# Altium footprint library STM32F0.PcbLib: 228 footprints (part 14 of 16)
Each footprint in its own frame and in the unit in brackets; x right, y up, seen from the top. Pads: shape width x height; smd on the part's side, far side on the other; paste and mask are expansions set on the pad; w line width, h text height; cw(c..) or ccw(c..) is an arc to the next point about the centre after c.
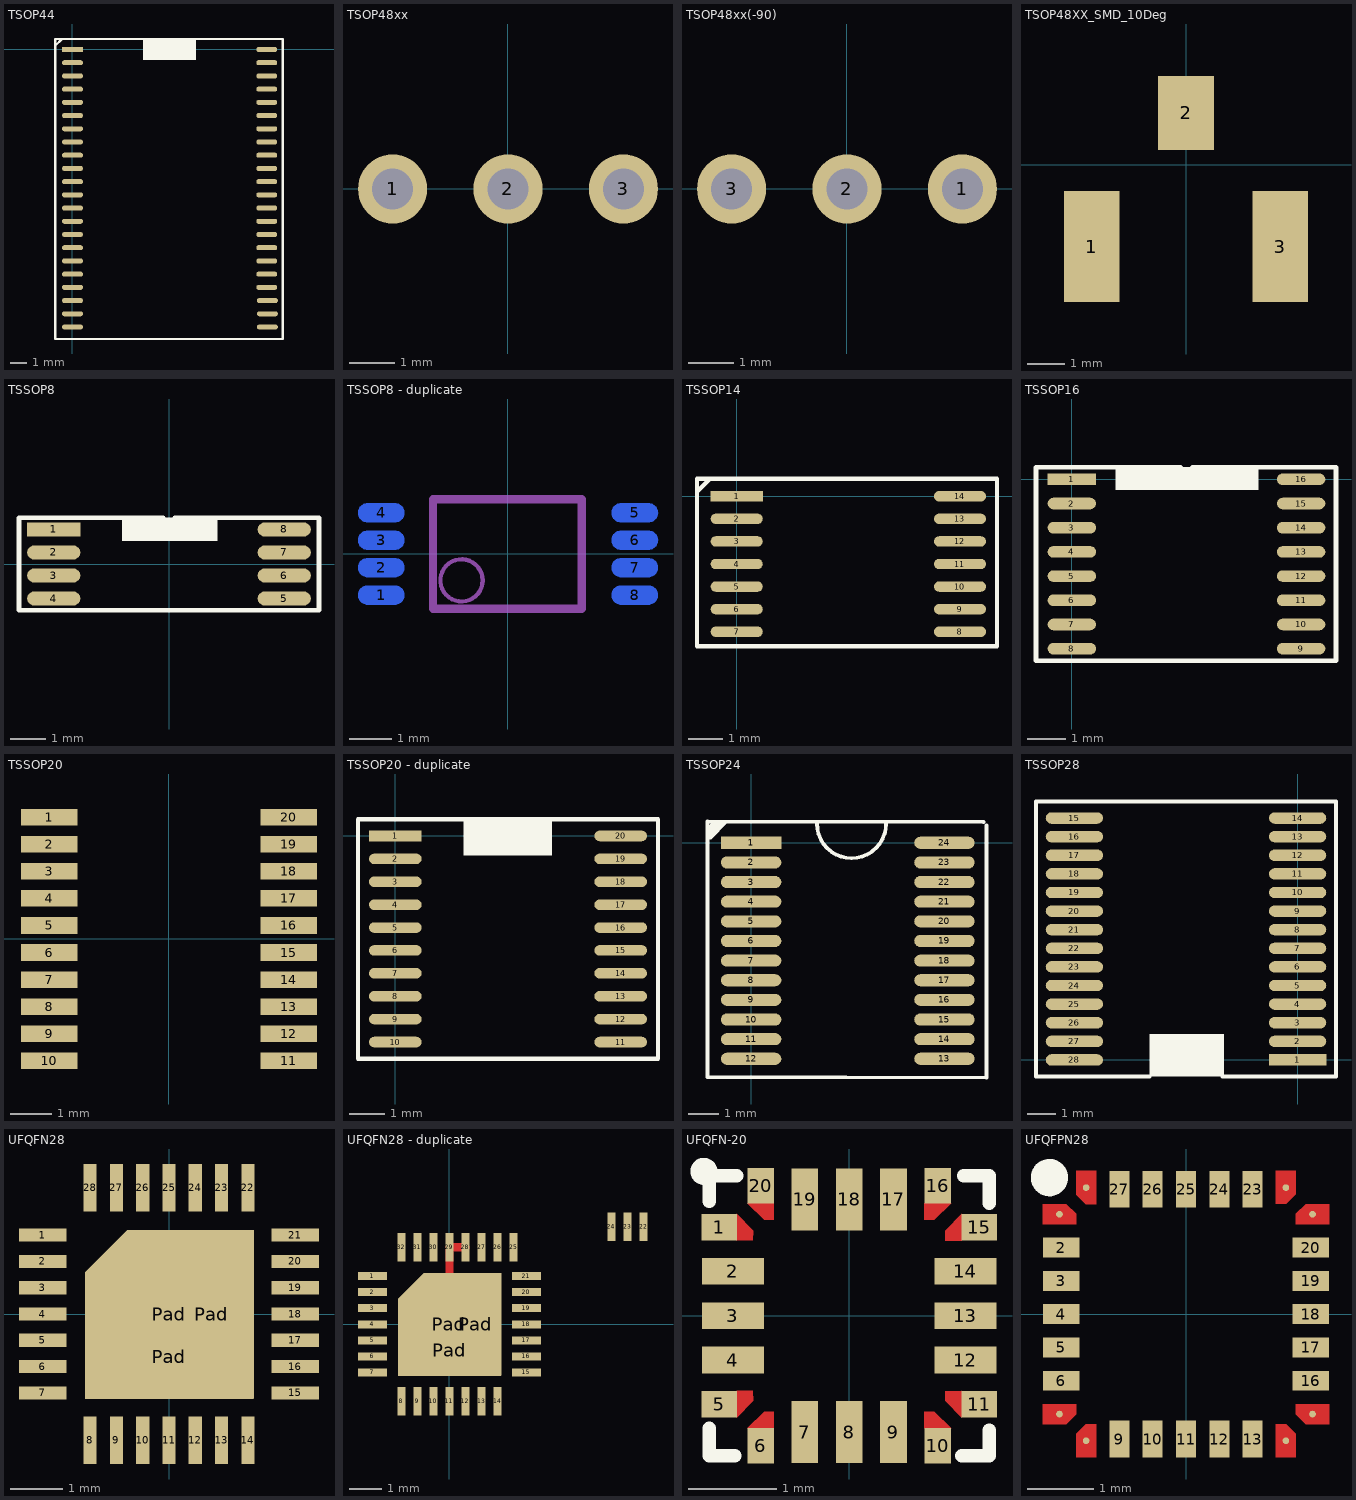
[diagram p13: the footprints below, top view; thin cyan lines are the x and y axes]

## TSOP44 [mil]
pads (44):
  rect 50x12 smd: 1(0,0)
  oval 50x12 smd: 2(0,-31.5) 3(0,-62.99) 4(0,-94.49) 5(0,-125.98) 6(0,-157.48) 7(0,-188.98) 8(0,-220.47) 9(0,-251.97) 10(0,-283.46) 11(0,-314.96) 12(0,-346.46) 13(0,-377.95) 14(0,-409.45) 15(0,-440.94) 16(0,-472.44) 17(0,-503.94) 18(0,-535.43) 19(0,-566.93) 20(0,-598.43) 21(0,-629.92) 22(0,-661.42) 23(464.57,-661.42) 24(464.57,-629.92) 25(464.57,-598.43) 26(462.99,-566.93) 27(462.99,-535.43) 28(462.99,-503.94) 29(462.99,-472.44) 30(462.99,-440.95) 31(462.99,-409.45) 32(462.99,-377.95) 33(462.99,-346.46) 34(462.99,-314.96) 35(462.99,-283.47) 36(462.99,-251.97) 37(462.99,-220.47) 38(462.99,-188.98) 39(462.99,-157.48) 40(462.99,-125.99) 41(462.99,-94.49) 42(462.99,-62.99) 43(462.99,-31.5) 44(462.99,0)
Top Overlay:
  rectangle: 168.31,-24.61 294.29,25
  lines w5: -41,7 -41,9 -25,25 ; -41,-690 -41,25 501,25 501,-690 -41,-690
3D body: height 12, standoff 0, extent -4,-5.68 18,6.32
3D body: height 25, standoff 12, extent 9.5,-5.68 42,6.32
3D body: height 12, standoff 0, extent -4,-37.18 18,-25.18
3D body: height 25, standoff 12, extent 9.5,-37.18 42,-25.18
3D body: height 12, standoff 0, extent -4,-68.68 18,-56.68
3D body: height 25, standoff 12, extent 9.5,-68.68 42,-56.68
3D body: height 12, standoff 0, extent -4,-100.17 18,-88.17
3D body: height 25, standoff 12, extent 9.5,-100.17 42,-88.17
3D body: height 25, standoff 12, extent 9.5,-226.16 42,-214.16
3D body: height 12, standoff 0, extent -4,-226.16 18,-214.16
3D body: height 25, standoff 12, extent 9.5,-194.66 42,-182.66
3D body: height 12, standoff 0, extent -4,-194.66 18,-182.66
3D body: height 25, standoff 12, extent 9.5,-163.16 42,-151.16
3D body: height 12, standoff 0, extent -4,-163.16 18,-151.16
3D body: height 25, standoff 12, extent 9.5,-131.67 42,-119.67
3D body: height 12, standoff 0, extent -4,-131.67 18,-119.67
3D body: height 25, standoff 12, extent 9.5,-352.14 42,-340.14
3D body: height 12, standoff 0, extent -4,-352.14 18,-340.14
3D body: height 25, standoff 12, extent 9.5,-320.65 42,-308.65
3D body: height 12, standoff 0, extent -4,-320.65 18,-308.65
3D body: height 25, standoff 12, extent 9.5,-289.15 42,-277.15
3D body: height 12, standoff 0, extent -4,-289.15 18,-277.15
3D body: height 25, standoff 12, extent 9.5,-257.65 42,-245.65
3D body: height 12, standoff 0, extent -4,-257.65 18,-245.65
3D body: height 25, standoff 12, extent 9.5,-478.13 42,-466.13
3D body: height 12, standoff 0, extent -4,-478.13 18,-466.13
3D body: height 25, standoff 12, extent 9.5,-446.63 42,-434.63
3D body: height 12, standoff 0, extent -4,-446.63 18,-434.63
3D body: height 25, standoff 12, extent 9.5,-415.13 42,-403.13
3D body: height 12, standoff 0, extent -4,-415.13 18,-403.13
3D body: height 25, standoff 12, extent 9.5,-383.64 42,-371.64
3D body: height 12, standoff 0, extent -4,-383.64 18,-371.64
3D body: height 25, standoff 12, extent 9.5,-604.11 42,-592.11
3D body: height 12, standoff 0, extent -4,-604.11 18,-592.11
3D body: height 25, standoff 12, extent 9.5,-572.61 42,-560.61
3D body: height 12, standoff 0, extent -4,-572.61 18,-560.61
3D body: height 25, standoff 12, extent 9.5,-541.12 42,-529.12
3D body: height 12, standoff 0, extent -4,-541.12 18,-529.12
3D body: height 25, standoff 12, extent 9.5,-509.62 42,-497.62
3D body: height 12, standoff 0, extent -4,-509.62 18,-497.62
3D body: height 25, standoff 12, extent 9.5,-667.1 42,-655.1
3D body: height 12, standoff 0, extent -4,-667.1 18,-655.1
3D body: height 25, standoff 12, extent 9.5,-635.61 42,-623.61
3D body: height 12, standoff 0, extent -4,-635.61 18,-623.61
3D body: height 12, standoff 0, extent 444.99,-37.81 466.99,-25.81
3D body: height 25, standoff 12, extent 420.99,-37.81 453.49,-25.81
3D body: height 12, standoff 0, extent 444.99,-6.32 466.99,5.68
3D body: height 25, standoff 12, extent 420.99,-6.32 453.49,5.68
3D body: height 12, standoff 0, extent 444.99,-163.8 466.99,-151.8
3D body: height 25, standoff 12, extent 420.99,-163.8 453.49,-151.8
3D body: height 12, standoff 0, extent 444.99,-132.3 466.99,-120.3
3D body: height 25, standoff 12, extent 420.99,-132.3 453.49,-120.3
3D body: height 12, standoff 0, extent 444.99,-100.8 466.99,-88.8
3D body: height 25, standoff 12, extent 420.99,-100.8 453.49,-88.8
3D body: height 12, standoff 0, extent 444.99,-69.31 466.99,-57.31
3D body: height 25, standoff 12, extent 420.99,-69.31 453.49,-57.31
3D body: height 12, standoff 0, extent 444.99,-289.78 466.99,-277.78
3D body: height 25, standoff 12, extent 420.99,-289.78 453.49,-277.78
3D body: height 12, standoff 0, extent 444.99,-258.29 466.99,-246.29
3D body: height 25, standoff 12, extent 420.99,-258.29 453.49,-246.29
3D body: height 12, standoff 0, extent 444.99,-226.79 466.99,-214.79
3D body: height 25, standoff 12, extent 420.99,-226.79 453.49,-214.79
3D body: height 12, standoff 0, extent 444.99,-195.29 466.99,-183.29
3D body: height 25, standoff 12, extent 420.99,-195.29 453.49,-183.29
3D body: height 12, standoff 0, extent 444.99,-415.77 466.99,-403.77
3D body: height 25, standoff 12, extent 420.99,-415.77 453.49,-403.77
3D body: height 12, standoff 0, extent 444.99,-384.27 466.99,-372.27
3D body: height 25, standoff 12, extent 420.99,-384.27 453.49,-372.27
3D body: height 12, standoff 0, extent 444.99,-352.77 466.99,-340.77
3D body: height 25, standoff 12, extent 420.99,-352.77 453.49,-340.77
3D body: height 12, standoff 0, extent 444.99,-321.28 466.99,-309.28
3D body: height 25, standoff 12, extent 420.99,-321.28 453.49,-309.28
3D body: height 12, standoff 0, extent 444.99,-541.75 466.99,-529.75
3D body: height 25, standoff 12, extent 420.99,-541.75 453.49,-529.75
3D body: height 12, standoff 0, extent 444.99,-510.25 466.99,-498.25
3D body: height 25, standoff 12, extent 420.99,-510.25 453.49,-498.25
3D body: height 12, standoff 0, extent 444.99,-478.76 466.99,-466.76
3D body: height 25, standoff 12, extent 420.99,-478.76 453.49,-466.76
3D body: height 12, standoff 0, extent 444.99,-447.26 466.99,-435.26
3D body: height 25, standoff 12, extent 420.99,-447.26 453.49,-435.26
3D body: height 25, standoff 12, extent 420.99,-573.25 453.49,-561.25
3D body: height 12, standoff 0, extent 444.99,-573.25 466.99,-561.25
3D body: height 25, standoff 12, extent 420.99,-604.74 453.49,-592.74
3D body: height 12, standoff 0, extent 444.99,-604.74 466.99,-592.74
3D body: height 25, standoff 12, extent 420.99,-636.24 453.49,-624.24
3D body: height 12, standoff 0, extent 444.99,-636.24 466.99,-624.24
3D body: height 25, standoff 12, extent 420.99,-667.73 453.49,-655.73
3D body: height 12, standoff 0, extent 444.99,-667.73 466.99,-655.73
3D body: height 40, standoff 0, extent 39.04,-685 423,24
3D body: height 41, standoff 40, extent 195.5,-9 273.5,16

## TSOP48xx [mil]
pads (3):
  round 60 hole 35.43: 1(-100,0) 2(0,0) 3(100,0)
3D body "IRreciver.stp": height 323.82, standoff -38.53, extent -118.1,-154.92 118.12,50.01

## TSOP48xx(-90) [mil]
pads (3):
  round 60 hole 35.43: 1(100,0) 2(0,0) 3(-100,0)
3D body "IRreciverBotton.stp": height 165.35, standoff -39.57, extent -118.11,-12.5 118.11,369.53

## TSOP48XX_SMD_10Deg [mm]
pads (3):
  rect 1.5x3 smd: 1(-2.54,-2.2) 3(2.54,-2.2)
  rect 1.5x2 smd: 2(0,1.4)
3D body "IRreciverSMD10deg.stp": height 9.33, standoff -1.02, extent -3,-5.254 3,2.11

## TSSOP8 [mm]
pads (8):
  rect 1.5x0.4 smd: 1(-3.25,0.975)
  oval 1.5x0.4 smd: 2(-3.25,0.325) 3(-3.25,-0.325) 4(-3.25,-0.975) 5(3.25,-0.975) 6(3.25,-0.325) 7(3.25,0.325) 8(3.25,0.975)
Top Overlay:
  rectangle: -1.32,0.645 1.373,1.305
  lines w0.127: -0.163,1.3 -4.23,1.3 -4.23,-1.3 4.23,-1.3 4.23,1.3 0.162,1.3
3D body: height 1.02, standoff 0, extent -2.424,-1.286 2.351,1.28
3D body: height 0.3, standoff 0, extent -3.314,0.797 -2.755,1.102
3D body: height 0.64, standoff 0.3, extent -2.971,0.797 -2.145,1.102
3D body: height 1.04, standoff 1.02, extent -1.028,0.594 0.954,1.229
3D body: height 0.64, standoff 0.3, extent -2.971,0.162 -2.145,0.467
3D body: height 0.3, standoff 0, extent -3.314,0.162 -2.755,0.467
3D body: height 0.64, standoff 0.3, extent -2.971,-0.473 -2.145,-0.168
3D body: height 0.3, standoff 0, extent -3.314,-0.473 -2.755,-0.168
3D body: height 0.64, standoff 0.3, extent -2.971,-1.108 -2.145,-0.803
3D body: height 0.3, standoff 0, extent -3.314,-1.108 -2.755,-0.803
3D body: height 0.64, standoff 0.3, extent 2.097,-1.108 2.922,-0.803
3D body: height 0.3, standoff 0, extent 2.706,-1.108 3.265,-0.803
3D body: height 0.64, standoff 0.3, extent 2.097,-0.473 2.922,-0.168
3D body: height 0.3, standoff 0, extent 2.706,-0.473 3.265,-0.168
3D body: height 0.64, standoff 0.3, extent 2.097,0.162 2.922,0.467
3D body: height 0.3, standoff 0, extent 2.706,0.162 3.265,0.467
3D body: height 0.64, standoff 0.3, extent 2.097,0.797 2.922,1.102
3D body: height 0.3, standoff 0, extent 2.706,0.797 3.265,1.102

## TSSOP8 - duplicate [mm]
height 1.2
pads (8):
  oval 1.1x0.45 smd far side: 1(-3,-0.975) 2(-3,-0.325) 3(-3,0.325) 4(-3,0.975) 5(3,0.975) 6(3,0.325) 7(3,-0.325) 8(3,-0.975)
Bottom Overlay:
  lines w0.2: -1.775,-1.3 -1.775,1.3 1.775,1.3 1.775,-1.3 0.7,-1.3 ccw(c0,-1.3) -0.7,-1.3 -1.775,-1.3
Bottom Assembly:
  circle w0.1: c-1.1,-0.625 r0.5
  lines w0.2: -1.775,-1.3 1.75,-1.3 1.75,1.3 -1.775,1.3 -1.775,-1.3
  text ".Designator" at -0.571,-1.67 h1
3D body "TSSOP8.step": height 1.11, standoff 0.02, extent -3.14,-1.4 3.14,1.6

## TSSOP14 [mm]
pads (14):
  rect 1.5x0.3 smd: 1(0,0)
  oval 1.5x0.3 smd: 2(0,-0.65) 3(0,-1.3) 4(0,-1.95) 5(0,-2.6) 6(0,-3.25) 7(0,-3.9) 8(6.426,-3.9) 9(6.426,-3.25) 10(6.426,-2.6) 11(6.426,-1.95) 12(6.426,-1.3) 13(6.426,-0.65) 14(6.426,0)
Top Overlay:
  lines w0.127: -1.143,0.127 -0.762,0.508 -1.143,0.508 ; -1.143,0.508 -1.143,-4.318 7.493,-4.318 7.493,0.508 -1.143,0.508
3D body: height 0.3, standoff 0, extent 5.905,-0.178 6.464,0.127
3D body: height 0.64, standoff 0.3, extent 5.296,-0.178 6.121,0.127
3D body: height 0.3, standoff 0, extent 5.905,-0.813 6.464,-0.508
3D body: height 0.64, standoff 0.3, extent 5.296,-0.813 6.121,-0.508
3D body: height 0.3, standoff 0, extent 5.905,-1.448 6.464,-1.143
3D body: height 0.64, standoff 0.3, extent 5.296,-1.448 6.121,-1.143
3D body: height 0.3, standoff 0, extent 5.905,-2.083 6.464,-1.778
3D body: height 0.64, standoff 0.3, extent 5.296,-2.083 6.121,-1.778
3D body: height 0.3, standoff 0, extent 5.905,-2.718 6.464,-2.413
3D body: height 0.64, standoff 0.3, extent 5.296,-2.718 6.121,-2.413
3D body: height 0.3, standoff 0, extent 5.905,-3.353 6.464,-3.048
3D body: height 0.64, standoff 0.3, extent 5.296,-3.353 6.121,-3.048
3D body: height 0.3, standoff 0, extent 5.905,-3.988 6.464,-3.683
3D body: height 0.64, standoff 0.3, extent 5.296,-3.988 6.121,-3.683
3D body: height 0.3, standoff 0, extent -0.114,-3.988 0.445,-3.683
3D body: height 0.64, standoff 0.3, extent 0.229,-3.988 1.054,-3.683
3D body: height 0.3, standoff 0, extent -0.114,-3.353 0.445,-3.048
3D body: height 0.64, standoff 0.3, extent 0.229,-3.353 1.054,-3.048
3D body: height 0.3, standoff 0, extent -0.114,-2.718 0.445,-2.413
3D body: height 0.64, standoff 0.3, extent 0.229,-2.718 1.054,-2.413
3D body: height 0.3, standoff 0, extent -0.114,-2.083 0.445,-1.778
3D body: height 0.64, standoff 0.3, extent 0.229,-2.083 1.054,-1.778
3D body: height 0.3, standoff 0, extent -0.114,-1.448 0.445,-1.143
3D body: height 0.64, standoff 0.3, extent 0.229,-1.448 1.054,-1.143
3D body: height 0.3, standoff 0, extent -0.114,-0.813 0.445,-0.508
3D body: height 0.64, standoff 0.3, extent 0.229,-0.813 1.054,-0.508
3D body: height 1.04, standoff 1.02, extent 2.172,-0.381 4.153,0.254
3D body: height 0.64, standoff 0.3, extent 0.229,-0.178 1.054,0.127
3D body: height 0.3, standoff 0, extent -0.114,-0.178 0.445,0.127
3D body: height 1.02, standoff 0, extent 0.774,-4.318 5.55,0.508

## TSSOP16 [mil]
pads (16):
  rect 50x12 smd: 1(0,0)
  oval 50x12 smd: 2(0,-25) 3(0,-50) 4(0,-75) 5(0,-100) 6(0,-125) 7(0,-150) 8(0,-175) 9(237,-175) 10(237,-150) 11(237,-125) 12(237,-100) 13(237,-75) 14(237,-50) 15(237,-25) 16(237,0)
Top Overlay:
  rectangle: 45,-11 193,12.5
  lines w5: 112.25,12.5 -37,12.5 -37,-187.5 273,-187.5 273,12.5 124.75,12.5
3D body: height 40, standoff 0, extent 24.04,-188 212,13
3D body: height 12, standoff 0, extent -11,-6 11,6
3D body: height 25, standoff 12, extent 2.5,-6 35,6
3D body: height 41, standoff 40, extent 79,-14 157,11
3D body: height 25, standoff 12, extent 2.5,-31 35,-19
3D body: height 12, standoff 0, extent -11,-31 11,-19
3D body: height 25, standoff 12, extent 2.5,-56 35,-44
3D body: height 12, standoff 0, extent -11,-56 11,-44
3D body: height 25, standoff 12, extent 2.5,-81 35,-69
3D body: height 12, standoff 0, extent -11,-81 11,-69
3D body: height 25, standoff 12, extent 2.5,-106 35,-94
3D body: height 12, standoff 0, extent -11,-106 11,-94
3D body: height 25, standoff 12, extent 2.5,-131 35,-119
3D body: height 12, standoff 0, extent -11,-131 11,-119
3D body: height 25, standoff 12, extent 2.5,-156 35,-144
3D body: height 12, standoff 0, extent -11,-156 11,-144
3D body: height 25, standoff 12, extent 2.5,-181 35,-169
3D body: height 12, standoff 0, extent -11,-181 11,-169
3D body: height 25, standoff 12, extent 202,-181 234.5,-169
3D body: height 12, standoff 0, extent 226,-181 248,-169
3D body: height 25, standoff 12, extent 202,-156 234.5,-144
3D body: height 12, standoff 0, extent 226,-156 248,-144
3D body: height 25, standoff 12, extent 202,-131 234.5,-119
3D body: height 12, standoff 0, extent 226,-131 248,-119
3D body: height 25, standoff 12, extent 202,-106 234.5,-94
3D body: height 12, standoff 0, extent 226,-106 248,-94
3D body: height 25, standoff 12, extent 202,-81 234.5,-69
3D body: height 12, standoff 0, extent 226,-81 248,-69
3D body: height 25, standoff 12, extent 202,-56 234.5,-44
3D body: height 12, standoff 0, extent 226,-56 248,-44
3D body: height 25, standoff 12, extent 202,-31 234.5,-19
3D body: height 12, standoff 0, extent 226,-31 248,-19
3D body: height 25, standoff 12, extent 202,-6 234.5,6
3D body: height 12, standoff 0, extent 226,-6 248,6

## TSSOP20 [mm]
pads (20):
  rect 1.35x0.4 smd: 1(-2.875,2.925) 2(-2.875,2.275) 3(-2.875,1.625) 4(-2.875,0.975) 5(-2.875,0.325) 6(-2.875,-0.325) 7(-2.875,-0.975) 8(-2.875,-1.625) 9(-2.875,-2.275) 10(-2.875,-2.925) 11(2.875,-2.925) 12(2.875,-2.275) 13(2.875,-1.625) 14(2.875,-0.975) 15(2.875,-0.325) 16(2.875,0.325) 17(2.875,0.975) 18(2.875,1.625) 19(2.875,2.275) 20(2.875,2.925)
3D body "User Library-tssop-20-1.step": height 1.2, standoff 0, extent -3.325,-3.3 3.275,3.3

## TSSOP20 - duplicate [mm]
pads (20):
  rect 1.5x0.3 smd: 1(0,0)
  oval 1.5x0.3 smd: 2(0,-0.65) 3(0,-1.3) 4(0,-1.95) 5(0,-2.6) 6(0,-3.25) 7(0,-3.9) 8(0,-4.55) 9(0,-5.2) 10(0,-5.85) 11(6.4,-5.85) 12(6.4,-5.2) 13(6.4,-4.55) 14(6.4,-3.9) 15(6.4,-3.25) 16(6.4,-2.6) 17(6.4,-1.95) 18(6.4,-1.3) 19(6.4,-0.65) 20(6.4,0)
Top Overlay:
  rectangle: 1.93,-0.559 4.445,0.479
  lines w0.127: -1.059,0 -1.059,0.055 ; -0.635,0.479 -1.059,0.479 ; -1.059,0.479 7.459,0.479 7.459,-6.329 -1.059,-6.329 -1.059,0.479
3D body: height 0.64, standoff 0.3, extent 0.241,-5.359 1.067,-5.055
3D body: height 0.3, standoff 0, extent -0.102,-5.359 0.457,-5.055
3D body: height 0.64, standoff 0.3, extent 0.241,-5.994 1.067,-5.69
3D body: height 0.3, standoff 0, extent -0.102,-5.994 0.457,-5.69
3D body: height 0.64, standoff 0.3, extent 5.309,-5.994 6.134,-5.69
3D body: height 0.3, standoff 0, extent 5.918,-5.994 6.477,-5.69
3D body: height 0.64, standoff 0.3, extent 5.309,-5.359 6.134,-5.055
3D body: height 0.3, standoff 0, extent 5.918,-5.359 6.477,-5.055
3D body: height 0.3, standoff 0, extent 5.931,-0.152 6.49,0.152
3D body: height 0.64, standoff 0.3, extent 5.321,-0.152 6.147,0.152
3D body: height 0.3, standoff 0, extent 5.931,-0.787 6.49,-0.483
3D body: height 0.64, standoff 0.3, extent 5.321,-0.787 6.147,-0.483
3D body: height 0.3, standoff 0, extent 5.931,-1.448 6.49,-1.143
3D body: height 0.64, standoff 0.3, extent 5.321,-1.448 6.147,-1.143
3D body: height 0.3, standoff 0, extent 5.931,-2.108 6.49,-1.803
3D body: height 0.64, standoff 0.3, extent 5.321,-2.108 6.147,-1.803
3D body: height 0.3, standoff 0, extent 5.931,-2.743 6.49,-2.438
3D body: height 0.64, standoff 0.3, extent 5.321,-2.743 6.147,-2.438
3D body: height 0.3, standoff 0, extent 5.931,-3.404 6.49,-3.099
3D body: height 0.64, standoff 0.3, extent 5.321,-3.404 6.147,-3.099
3D body: height 0.3, standoff 0, extent 5.931,-4.064 6.49,-3.759
3D body: height 0.64, standoff 0.3, extent 5.321,-4.064 6.147,-3.759
3D body: height 0.3, standoff 0, extent 5.931,-4.699 6.49,-4.394
3D body: height 0.64, standoff 0.3, extent 5.321,-4.699 6.147,-4.394
3D body: height 0.3, standoff 0, extent -0.089,-4.699 0.47,-4.394
3D body: height 0.64, standoff 0.3, extent 0.254,-4.699 1.079,-4.394
3D body: height 0.3, standoff 0, extent -0.089,-4.064 0.47,-3.759
3D body: height 0.64, standoff 0.3, extent 0.254,-4.064 1.079,-3.759
3D body: height 0.3, standoff 0, extent -0.089,-3.404 0.47,-3.099
3D body: height 0.64, standoff 0.3, extent 0.254,-3.404 1.079,-3.099
3D body: height 0.3, standoff 0, extent -0.089,-2.743 0.47,-2.438
3D body: height 0.64, standoff 0.3, extent 0.254,-2.743 1.079,-2.438
3D body: height 0.3, standoff 0, extent -0.089,-2.108 0.47,-1.803
3D body: height 0.64, standoff 0.3, extent 0.254,-2.108 1.079,-1.803
3D body: height 0.3, standoff 0, extent -0.089,-1.448 0.47,-1.143
3D body: height 0.64, standoff 0.3, extent 0.254,-1.448 1.079,-1.143
3D body: height 0.3, standoff 0, extent -0.089,-0.787 0.47,-0.483
3D body: height 0.64, standoff 0.3, extent 0.254,-0.787 1.079,-0.483
3D body: height 1.04, standoff 1.02, extent 2.197,-0.356 4.178,0.279
3D body: height 0.64, standoff 0.3, extent 0.254,-0.152 1.079,0.152
3D body: height 0.3, standoff 0, extent -0.089,-0.152 0.47,0.152
3D body: height 1.02, standoff 0, extent 0.801,-6.325 5.575,0.33

## TSSOP24 [mm]
pads (24):
  rect 2x0.4 smd: 1(0,0)
  oval 2x0.4 smd: 2(0,-0.65) 3(0,-1.3) 4(0,-1.95) 5(0,-2.6) 6(0,-3.25) 7(0,-3.9) 8(0,-4.55) 9(0,-5.2) 10(0,-5.85) 11(0,-6.5) 12(0,-7.15) 13(6.4,-7.15) 14(6.4,-6.5) 15(6.4,-5.85) 16(6.4,-5.2) 17(6.4,-4.55) 18(6.4,-3.9) 19(6.4,-3.25) 20(6.4,-2.6) 21(6.4,-1.95) 22(6.4,-1.3) 23(6.4,-0.65) 24(6.4,0)
Top Overlay:
  lines w0.127: 2.179,0.635 ccw(c3.325,0.635) 4.47,0.635 ; 7.696,0.686 -1.446,0.706 -1.446,-7.754 7.795,-7.78 7.795,0.579 ; -1.067,0.684 -1.067,0.686 -1.067,0.684 ; -1.067,0.684 -1.446,0.305 -1.446,0.432 -1.194,0.684 -1.067,0.684 ; -1.446,0.178 -0.938,0.686 -0.838,0.686 -1.346,0.178 -1.446,0.178
3D body: height 0.3, standoff 0, extent 5.867,-6.68 6.426,-6.375
3D body: height 0.64, standoff 0.3, extent 5.258,-6.68 6.083,-6.375
3D body: height 0.3, standoff 0, extent 5.867,-7.315 6.426,-7.01
3D body: height 0.64, standoff 0.3, extent 5.258,-7.315 6.083,-7.01
3D body: height 0.3, standoff 0, extent -0.152,-7.315 0.406,-7.01
3D body: height 0.64, standoff 0.3, extent 0.191,-7.315 1.016,-7.01
3D body: height 0.3, standoff 0, extent -0.152,-6.68 0.406,-6.375
3D body: height 0.64, standoff 0.3, extent 0.191,-6.68 1.016,-6.375
3D body: height 0.64, standoff 0.3, extent 0.191,-5.385 1.016,-5.08
3D body: height 0.3, standoff 0, extent -0.152,-5.385 0.406,-5.08
3D body: height 0.64, standoff 0.3, extent 0.191,-6.02 1.016,-5.715
3D body: height 0.3, standoff 0, extent -0.152,-6.02 0.406,-5.715
3D body: height 0.64, standoff 0.3, extent 5.258,-6.02 6.083,-5.715
3D body: height 0.3, standoff 0, extent 5.867,-6.02 6.426,-5.715
3D body: height 0.64, standoff 0.3, extent 5.258,-5.385 6.083,-5.08
3D body: height 0.3, standoff 0, extent 5.867,-5.385 6.426,-5.08
3D body: height 0.3, standoff 0, extent 5.88,-0.178 6.439,0.127
3D body: height 0.64, standoff 0.3, extent 5.271,-0.178 6.096,0.127
3D body: height 0.3, standoff 0, extent 5.88,-0.813 6.439,-0.508
3D body: height 0.64, standoff 0.3, extent 5.271,-0.813 6.096,-0.508
3D body: height 0.3, standoff 0, extent 5.88,-1.473 6.439,-1.168
3D body: height 0.64, standoff 0.3, extent 5.271,-1.473 6.096,-1.168
3D body: height 0.3, standoff 0, extent 5.88,-2.134 6.439,-1.829
3D body: height 0.64, standoff 0.3, extent 5.271,-2.134 6.096,-1.829
3D body: height 0.3, standoff 0, extent 5.88,-2.769 6.439,-2.464
3D body: height 0.64, standoff 0.3, extent 5.271,-2.769 6.096,-2.464
3D body: height 0.3, standoff 0, extent 5.88,-3.429 6.439,-3.124
3D body: height 0.64, standoff 0.3, extent 5.271,-3.429 6.096,-3.124
3D body: height 0.3, standoff 0, extent 5.88,-4.089 6.439,-3.785
3D body: height 0.64, standoff 0.3, extent 5.271,-4.089 6.096,-3.785
3D body: height 0.3, standoff 0, extent 5.88,-4.724 6.439,-4.42
3D body: height 0.64, standoff 0.3, extent 5.271,-4.724 6.096,-4.42
3D body: height 0.3, standoff 0, extent -0.14,-4.724 0.419,-4.42
3D body: height 0.64, standoff 0.3, extent 0.203,-4.724 1.029,-4.42
3D body: height 0.3, standoff 0, extent -0.14,-4.089 0.419,-3.785
3D body: height 0.64, standoff 0.3, extent 0.203,-4.089 1.029,-3.785
3D body: height 0.3, standoff 0, extent -0.14,-3.429 0.419,-3.124
3D body: height 0.64, standoff 0.3, extent 0.203,-3.429 1.029,-3.124
3D body: height 0.3, standoff 0, extent -0.14,-2.769 0.419,-2.464
3D body: height 0.64, standoff 0.3, extent 0.203,-2.769 1.029,-2.464
3D body: height 0.3, standoff 0, extent -0.14,-2.134 0.419,-1.829
3D body: height 0.64, standoff 0.3, extent 0.203,-2.134 1.029,-1.829
3D body: height 0.3, standoff 0, extent -0.14,-1.473 0.419,-1.168
3D body: height 0.64, standoff 0.3, extent 0.203,-1.473 1.029,-1.168
3D body: height 0.3, standoff 0, extent -0.14,-0.813 0.419,-0.508
3D body: height 0.64, standoff 0.3, extent 0.203,-0.813 1.029,-0.508
3D body: height 1.04, standoff 1.02, extent 2.146,-0.381 4.127,0.254
3D body: height 0.64, standoff 0.3, extent 0.203,-0.178 1.029,0.127
3D body: height 0.3, standoff 0, extent -0.14,-0.178 0.419,0.127
3D body: height 1.02, standoff 0, extent 0.75,-7.569 5.524,0.305

## TSSOP28 [mm]
pads (28):
  rect 2x0.4 smd: 1(0,0)
  oval 2x0.4 smd: 2(0,0.65) 3(0,1.3) 4(0,1.95) 5(0,2.6) 6(0,3.25) 7(0,3.9) 8(0,4.55) 9(0,5.2) 10(0,5.85) 11(0,6.5) 12(0,7.15) 13(0,7.8) 14(0,8.45) 15(-7.8,8.45) 16(-7.8,7.8) 17(-7.8,7.15) 18(-7.8,6.5) 19(-7.8,5.85) 20(-7.8,5.2) 21(-7.8,4.55) 22(-7.8,3.9) 23(-7.8,3.25) 24(-7.8,2.6) 25(-7.8,1.95) 26(-7.8,1.3) 27(-7.8,0.65) 28(-7.8,0)
Top Overlay:
  rectangle: -5.17,-0.579 -2.575,0.9
  lines w0.127: -5.17,-0.579 -9.14,-0.579 -9.14,9.029 1.34,9.029 1.34,-0.579 -2.63,-0.579
3D body: height 0.3, standoff 0, extent -7.201,7.645 -6.642,7.95
3D body: height 0.64, standoff 0.3, extent -6.858,7.645 -6.032,7.95
3D body: height 0.3, standoff 0, extent -7.201,8.28 -6.642,8.585
3D body: height 0.64, standoff 0.3, extent -6.858,8.28 -6.032,8.585
3D body: height 0.3, standoff 0, extent -1.181,8.28 -0.622,8.585
3D body: height 0.64, standoff 0.3, extent -1.791,8.28 -0.965,8.585
3D body: height 0.3, standoff 0, extent -1.181,7.645 -0.622,7.95
3D body: height 0.64, standoff 0.3, extent -1.791,7.645 -0.965,7.95
3D body: height 1.02, standoff 0, extent -6.223,-0.33 -1.449,8.788
3D body: height 0.3, standoff 0, extent -1.118,-0.152 -0.559,0.152
3D body: height 0.64, standoff 0.3, extent -1.727,-0.152 -0.902,0.152
3D body: height 1.04, standoff 1.02, extent -4.826,-0.279 -2.845,0.356
3D body: height 0.64, standoff 0.3, extent -1.727,0.483 -0.902,0.787
3D body: height 0.3, standoff 0, extent -1.118,0.483 -0.559,0.787
3D body: height 0.64, standoff 0.3, extent -1.727,1.143 -0.902,1.448
3D body: height 0.3, standoff 0, extent -1.118,1.143 -0.559,1.448
3D body: height 0.64, standoff 0.3, extent -1.727,1.803 -0.902,2.108
3D body: height 0.3, standoff 0, extent -1.118,1.803 -0.559,2.108
3D body: height 0.64, standoff 0.3, extent -1.727,2.438 -0.902,2.743
3D body: height 0.3, standoff 0, extent -1.118,2.438 -0.559,2.743
3D body: height 0.64, standoff 0.3, extent -1.727,3.099 -0.902,3.404
3D body: height 0.3, standoff 0, extent -1.118,3.099 -0.559,3.404
3D body: height 0.64, standoff 0.3, extent -1.727,3.759 -0.902,4.064
3D body: height 0.3, standoff 0, extent -1.118,3.759 -0.559,4.064
3D body: height 0.64, standoff 0.3, extent -1.727,4.394 -0.902,4.699
3D body: height 0.3, standoff 0, extent -1.118,4.394 -0.559,4.699
3D body: height 0.64, standoff 0.3, extent -6.794,4.394 -5.969,4.699
3D body: height 0.3, standoff 0, extent -7.137,4.394 -6.579,4.699
3D body: height 0.64, standoff 0.3, extent -6.794,3.759 -5.969,4.064
3D body: height 0.3, standoff 0, extent -7.137,3.759 -6.579,4.064
3D body: height 0.64, standoff 0.3, extent -6.794,3.099 -5.969,3.404
3D body: height 0.3, standoff 0, extent -7.137,3.099 -6.579,3.404
3D body: height 0.64, standoff 0.3, extent -6.794,2.438 -5.969,2.743
3D body: height 0.3, standoff 0, extent -7.137,2.438 -6.579,2.743
3D body: height 0.64, standoff 0.3, extent -6.794,1.803 -5.969,2.108
3D body: height 0.3, standoff 0, extent -7.137,1.803 -6.579,2.108
3D body: height 0.64, standoff 0.3, extent -6.794,1.143 -5.969,1.448
3D body: height 0.3, standoff 0, extent -7.137,1.143 -6.579,1.448
3D body: height 0.64, standoff 0.3, extent -6.794,0.483 -5.969,0.787
3D body: height 0.3, standoff 0, extent -7.137,0.483 -6.579,0.787
3D body: height 0.64, standoff 0.3, extent -6.794,-0.152 -5.969,0.152
3D body: height 0.3, standoff 0, extent -7.137,-0.152 -6.579,0.152
3D body: height 0.3, standoff 0, extent -7.125,5.055 -6.566,5.359
3D body: height 0.64, standoff 0.3, extent -6.782,5.055 -5.956,5.359
3D body: height 0.3, standoff 0, extent -7.125,5.69 -6.566,5.994
3D body: height 0.64, standoff 0.3, extent -6.782,5.69 -5.956,5.994
3D body: height 0.3, standoff 0, extent -1.105,5.69 -0.546,5.994
3D body: height 0.64, standoff 0.3, extent -1.714,5.69 -0.889,5.994
3D body: height 0.3, standoff 0, extent -1.105,5.055 -0.546,5.359
3D body: height 0.64, standoff 0.3, extent -1.714,5.055 -0.889,5.359
3D body: height 0.64, standoff 0.3, extent -1.714,6.35 -0.889,6.655
3D body: height 0.3, standoff 0, extent -1.105,6.35 -0.546,6.655
3D body: height 0.64, standoff 0.3, extent -1.714,6.985 -0.889,7.29
3D body: height 0.3, standoff 0, extent -1.105,6.985 -0.546,7.29
3D body: height 0.64, standoff 0.3, extent -6.782,6.985 -5.956,7.29
3D body: height 0.3, standoff 0, extent -7.125,6.985 -6.566,7.29
3D body: height 0.64, standoff 0.3, extent -6.782,6.35 -5.956,6.655
3D body: height 0.3, standoff 0, extent -7.125,6.35 -6.566,6.655

## UFQFN28 [mm]
pads (31):
  rect 0.9x0.25 smd: 1(-2.4,1.5) 2(-2.4,1) 3(-2.4,0.5) 4(-2.4,0) 5(-2.4,-0.5) 6(-2.4,-1) 7(-2.4,-1.5) 15(2.4,-1.5) 16(2.4,-1) 17(2.4,-0.5) 18(2.4,0) 19(2.4,0.5) 20(2.4,1) 21(2.4,1.5)
  rect 0.25x0.9 smd: 8(-1.5,-2.4) 9(-1,-2.4) 10(-0.5,-2.4) 11(0,-2.4) 12(0.5,-2.4) 13(1,-2.4) 14(1.5,-2.4) 22(1.5,2.4) 23(1,2.4) 24(0.5,2.4) 25(0,2.4) 26(-0.5,2.4) 27(-1,2.4) 28(-1.5,2.4)
  oct 3.2x3.2 smd: Pad(0,0)
  rect 3.2x1.6 smd: Pad(0.002,-0.812)
  rect 1.6x3.2 smd: Pad(0.816,-0.004)
3D body "User Library-QFN28-0_5.STEP": height 1, standoff 0, extent -2.5,-2.5 2.5,2.5

## UFQFN28 - duplicate [mm]
pads (35):
  rect 0.9x0.25 smd: 1(-2.4,1.5) 2(-2.4,1) 3(-2.4,0.5) 4(-2.4,0) 5(-2.4,-0.5) 6(-2.4,-1) 7(-2.4,-1.5) 15(2.4,-1.5) 16(2.4,-1) 17(2.4,-0.5) 18(2.4,0) 19(2.4,0.5) 20(2.4,1) 21(2.4,1.5)
  rect 0.25x0.9 smd: 8(-1.5,-2.4) 9(-1,-2.4) 10(-0.5,-2.4) 11(0,-2.4) 12(0.5,-2.4) 13(1,-2.4) 14(1.5,-2.4) 22(6.05,3.04) 23(5.55,3.04) 24(5.05,3.04) 25(2,2.4) 26(1.5,2.4) 27(1,2.4) 28(0.5,2.4) 29(0,2.4) 30(-0.5,2.4) 31(-1,2.4) 32(-1.5,2.4)
  oct 3.2x3.2 smd: Pad(0,0)
  rect 3.2x1.6 smd: Pad(0.002,-0.812)
  rect 1.6x3.2 smd: Pad(0.816,-0.004)
Top Layer:
  lines w0.254: 0,0 0,2.4 0.5,2.4
3D body "User Library-QFN28-0_5.STEP": height 1, standoff 0, extent -2.5,-2.5 2.5,2.5

## UFQFN-20 [mm]
pads (20):
  rect 0.4x0.3 smd: 1(-1.469,1) 5(-1.469,-1) 11(1.469,-1) 15(1.469,1)
  rect 0.7x0.3 smd: 2(-1.312,0.5) 3(-1.312,0) 4(-1.312,-0.5) 12(1.312,-0.5) 13(1.312,0) 14(1.312,0.5)
  rect 0.3x0.4 smd: 6(-1,-1.469) 10(1,-1.469) 16(1,1.469) 20(-1,1.469)
  rect 0.3x0.7 smd: 7(-0.5,-1.312) 8(0,-1.312) 9(0.5,-1.312) 17(0.5,1.312) 18(0,1.312) 19(-0.5,1.312)
Top Layer:
  region: -1.27,0.85 -1.086,0.85 -1.086,0.959 -1.27,1.15
  region: 1.27,-0.85 1.086,-0.85 1.086,-0.959 1.27,-1.15
  region: 0.85,1.27 0.85,1.086 0.959,1.086 1.15,1.27
  region: -0.85,-1.27 -0.85,-1.086 -0.959,-1.086 -1.15,-1.27
  region: -0.849,1.27 -0.849,1.086 -0.959,1.086 -1.15,1.27
  region: 1.27,0.849 1.086,0.849 1.086,0.959 1.27,1.15
  region: 0.849,-1.27 0.849,-1.086 0.959,-1.086 1.15,-1.27
  region: -1.27,-0.849 -1.086,-0.849 -1.086,-0.959 -1.27,-1.15
Top Overlay:
  circle w0.15: c-1.64,1.63 r0.078
  lines w0.15: -1.58,-1.27 -1.58,-1.58 -1.29,-1.58 ; -1.58,1.29 -1.58,1.58 -1.27,1.58 ; 1.27,-1.58 1.58,-1.58 1.58,-1.29 ; 1.29,1.58 1.58,1.58 1.58,1.27
Top Solder:
  region: -1.27,-0.849 -1.086,-0.849 -1.086,-0.959 -1.27,-1.15
  region: 0.849,-1.27 0.849,-1.086 0.959,-1.086 1.15,-1.27
  region: 1.27,0.849 1.086,0.849 1.086,0.959 1.27,1.15
  region: -0.849,1.27 -0.849,1.086 -0.959,1.086 -1.15,1.27
  region: -0.85,-1.27 -0.85,-1.086 -0.959,-1.086 -1.15,-1.27
  region: 0.85,1.27 0.85,1.086 0.959,1.086 1.15,1.27
  region: 1.27,-0.85 1.086,-0.85 1.086,-0.959 1.27,-1.15
  region: -1.27,0.85 -1.086,0.85 -1.086,0.959 -1.27,1.15
3D body "User Library-UFQFPN20-1.step": height 0.55, standoff 0, extent -1.5,-1.5 1.5,1.5

## UFQFPN28 [mm]
pads (28):
  round 0.1 smd: 1(-1.9,1.5) 7(-1.9,-1.5) 8(-1.5,-1.9) 14(1.5,-1.9) 15(1.9,-1.5) 21(1.9,1.5) 22(1.5,1.9) 28(-1.5,1.9)
  rect 0.55x0.3 smd: 2(-1.875,1) 3(-1.875,0.5) 4(-1.875,0) 5(-1.875,-0.5) 6(-1.875,-1) 16(1.875,-1) 17(1.875,-0.5) 18(1.875,0) 19(1.875,0.5) 20(1.875,1)
  rect 0.3x0.55 smd: 9(-1,-1.875) 10(-0.5,-1.875) 11(0,-1.875) 12(0.5,-1.875) 13(1,-1.875) 23(1,1.875) 24(0.5,1.875) 25(0,1.875) 26(-0.5,1.875) 27(-1,1.875)
Top Layer:
  region: -2.15,-1.65 -2.15,-1.35 -1.65,-1.35 -1.65,-1.505 -1.795,-1.65
  region: 1.65,-2.15 1.35,-2.15 1.35,-1.65 1.505,-1.65 1.65,-1.795
  region: 2.15,-1.65 2.15,-1.35 1.65,-1.35 1.65,-1.505 1.795,-1.65
  region: -1.65,-2.15 -1.35,-2.15 -1.35,-1.65 -1.505,-1.65 -1.65,-1.795
  region: -2.15,1.65 -2.15,1.35 -1.65,1.35 -1.65,1.505 -1.795,1.65
  region: -1.65,2.15 -1.35,2.15 -1.35,1.65 -1.505,1.65 -1.65,1.795
  region: 2.15,1.65 2.15,1.35 1.65,1.35 1.65,1.505 1.795,1.65
  region: 1.65,2.155 1.35,2.155 1.35,1.655 1.505,1.655 1.65,1.8
Top Overlay:
  circle w0.3: c-2.05,2.05 r0.13
Top Paste:
  region: -2.15,-1.65 -2.15,-1.35 -1.65,-1.35 -1.65,-1.4 -1.9,-1.65
  region: 1.65,-2.15 1.35,-2.15 1.35,-1.65 1.4,-1.65 1.65,-1.9
  region: 2.15,-1.65 2.15,-1.35 1.65,-1.35 1.65,-1.4 1.9,-1.65
  region: -1.65,-2.15 -1.35,-2.15 -1.35,-1.65 -1.4,-1.65 -1.65,-1.9
  region: -2.15,1.65 -2.15,1.35 -1.65,1.35 -1.65,1.4 -1.9,1.65
  region: -1.65,2.15 -1.35,2.15 -1.35,1.65 -1.4,1.65 -1.65,1.9
  region: 2.15,1.65 2.15,1.35 1.65,1.35 1.65,1.4 1.9,1.65
  region: 1.65,2.155 1.35,2.155 1.35,1.655 1.4,1.655 1.65,1.905
Top Solder:
  region: -2.25,-1.75 -2.25,-1.25 -1.55,-1.25 -1.55,-1.555 -1.745,-1.75
  region: 1.75,-2.25 1.25,-2.25 1.25,-1.55 1.555,-1.55 1.75,-1.745
  region: 2.25,-1.75 2.25,-1.25 1.55,-1.25 1.55,-1.555 1.745,-1.75
  region: -1.75,-2.25 -1.25,-2.25 -1.25,-1.55 -1.555,-1.55 -1.75,-1.745
  region: -2.25,1.75 -2.25,1.25 -1.55,1.25 -1.55,1.555 -1.745,1.75
  region: -1.75,2.25 -1.25,2.25 -1.25,1.55 -1.555,1.55 -1.75,1.745
  region: 2.25,1.75 2.25,1.25 1.55,1.25 1.55,1.555 1.745,1.75
  region: 1.75,2.255 1.25,2.255 1.25,1.555 1.555,1.555 1.75,1.75
3D body "User Library-UFQFPN28-1.step": height 0.55, standoff 0, extent -2,-2 2,2